# Altium schematic symbol library FPGA_Xilinx_Virtex5.SchLib: 41 symbols (part 20 of 27)
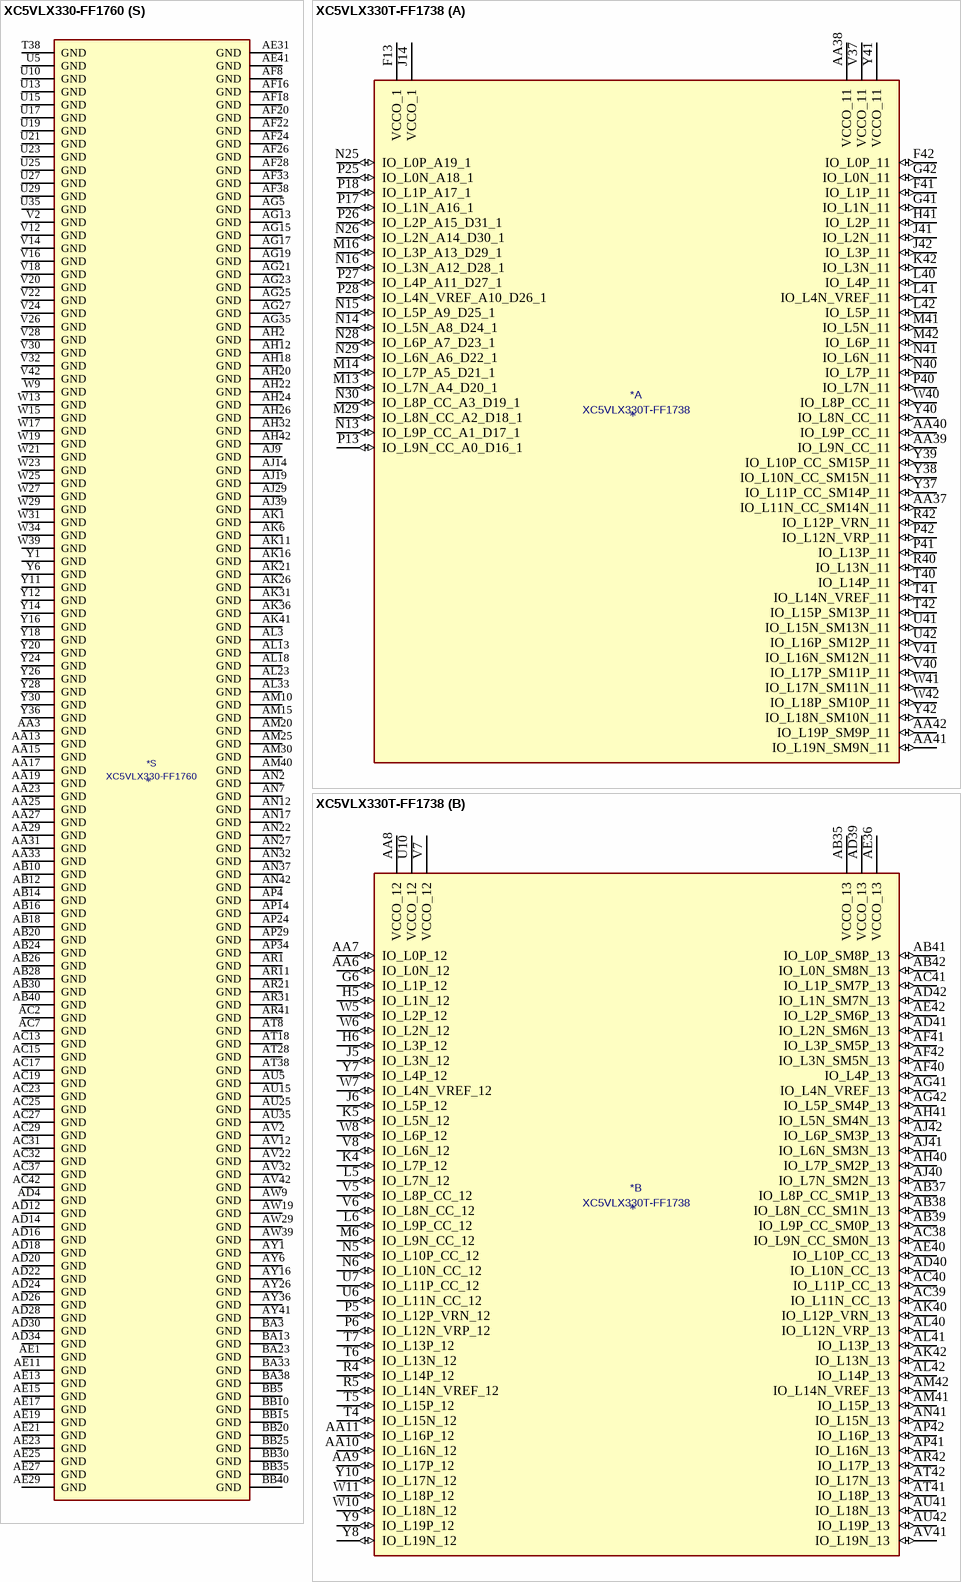
[diagram p156: symbols XC5VLX330-FF1760 to XC5VLX330T-FF1738]

## XC5VLX330-FF1760
designator *  value XC5VLX330-FF1760
ki_keywords: FPGA; ki_description: Virtex 5 LX 330 XC5VLX330-FF1760
part A pins: AA37 IO_L11N_CC_SM14N_11 (io), AA39 IO_L9N_CC_11 (io), AA40 IO_L9P_CC_11 (io), AA41 IO_L19N_SM9N_11 (io), AA42 IO_L19P_SM9P_11 (io), E16 VCCO_1 (power), F41 IO_L1P_11 (io), F42 IO_L0P_11 (io), G41 IO_L1N_11 (io), G42 IO_L0N_11 (io), H41 IO_L2P_11 (io), J14 VCCO_1 (power), J41 IO_L2N_11 (io), J42 IO_L3P_11 (io), K42 IO_L3N_11 (io), L40 IO_L4P_11 (io), L41 IO_L4N_VREF_11 (io), L42 IO_L5P_11 (io), M13 IO_L1P_A17_1 (io), M29 IO_L6N_A6_D22_1 (io), M41 IO_L5N_11 (io), M42 IO_L6P_11 (io), N13 IO_L1N_A16_1 (io), N14 IO_L7P_A5_D21_1 (io), N15 IO_L5P_A9_D25_1 (io), N28 IO_L4P_A11_D27_1 (io), N29 IO_L6P_A7_D23_1 (io), N30 IO_L8N_CC_A2_D18_1 (io), N40 IO_L7P_11 (io), N41 IO_L6N_11 (io), P13 IO_L7N_A4_D20_1 (io), P15 IO_L5N_A8_D24_1 (io), P16 IO_L9P_CC_A1_D17_1 (io), P17 IO_L3P_A13_D29_1 (io), P26 IO_L2N_A14_D30_1 (io), P27 IO_L2P_A15_D31_1 (io), P28 IO_L4N_VREF_A10_D26_1 (io), P30 IO_L8P_CC_A3_D19_1 (io), P40 IO_L7N_11 (io), P41 IO_L13P_11 (io), P42 IO_L12N_VRP_11 (io), R15 IO_L9N_CC_A0_D16_1 (io), R17 IO_L3N_A12_D28_1 (io), R27 IO_L0N_A18_1 (io), R28 IO_L0P_A19_1 (io), R40 IO_L13N_11 (io), R42 IO_L12P_VRN_11 (io), T40 IO_L14P_11 (io), T41 IO_L14N_VREF_11 (io), T42 IO_L15P_SM13P_11 (io), U40 VCCO_11 (power), U41 IO_L15N_SM13N_11 (io), U42 IO_L16P_SM12P_11 (io), V37 VCCO_11 (power), V40 IO_L17P_SM11P_11 (io), V41 IO_L16N_SM12N_11 (io), W40 IO_L8P_CC_11 (io), W41 IO_L17N_SM11N_11 (io), W42 IO_L18P_SM10P_11 (io), Y37 IO_L11P_CC_SM14P_11 (io), Y38 IO_L10N_CC_SM15N_11 (io), Y39 IO_L10P_CC_SM15P_11 (io), Y40 IO_L8N_CC_11 (io), Y41 VCCO_11 (power), Y42 IO_L18N_SM10N_11 (io)
part B pins: AA1 IO_L18P_12 (io), AA2 IO_L18N_12 (io), AA4 IO_L16P_12 (io), AA5 IO_L17N_12 (io), AA8 VCCO_12 (power), AA38 VCCO_13 (power), AB5 VCCO_12 (power), AB35 VCCO_13 (power), AB37 IO_L8P_CC_SM1P_13 (io), AB38 IO_L8N_CC_SM1N_13 (io), AB39 IO_L9P_CC_SM0P_13 (io), AB41 IO_L0P_SM8P_13 (io), AB42 IO_L0N_SM8N_13 (io), AC38 IO_L9N_CC_SM0N_13 (io), AC39 IO_L11N_CC_13 (io), AC40 IO_L11P_CC_13 (io), AC41 IO_L1P_SM7P_13 (io), AD39 VCCO_13 (power), AD40 IO_L10N_CC_13 (io), AD41 IO_L2N_SM6N_13 (io), AD42 IO_L1N_SM7N_13 (io), AE40 IO_L10P_CC_13 (io), AE42 IO_L2P_SM6P_13 (io), AF40 IO_L4P_13 (io), AF41 IO_L3P_SM5P_13 (io), AF42 IO_L3N_SM5N_13 (io), AG41 IO_L4N_VREF_13 (io), AG42 IO_L5P_SM4P_13 (io), AH40 IO_L7P_SM2P_13 (io), AH41 IO_L5N_SM4N_13 (io), AJ40 IO_L7N_SM2N_13 (io), AJ41 IO_L6N_SM3N_13 (io), AJ42 IO_L6P_SM3P_13 (io), AK40 IO_L12P_VRN_13 (io), AK42 IO_L13N_13 (io), AL40 IO_L12N_VRP_13 (io), AL41 IO_L13P_13 (io), AL42 IO_L14P_13 (io), AM41 IO_L15P_13 (io), AM42 IO_L14N_VREF_13 (io), AN41 IO_L15N_13 (io), AP41 IO_L16N_13 (io), AP42 IO_L16P_13 (io), AR42 IO_L17P_13 (io), AT41 IO_L18P_13 (io), AT42 IO_L17N_13 (io), AU41 IO_L18N_13 (io), AU42 IO_L19P_13 (io), AV41 IO_L19N_13 (io), E2 IO_L0P_12 (io), F1 IO_L1N_12 (io), F2 IO_L0N_12 (io), G1 IO_L3P_12 (io), G2 IO_L1P_12 (io), H1 IO_L3N_12 (io), J1 IO_L2N_12 (io), J2 IO_L2P_12 (io), K2 IO_L5P_12 (io), L1 IO_L5N_12 (io), L2 IO_L4P_12 (io), M1 IO_L6P_12 (io), M2 IO_L4N_VREF_12 (io), M3 IO_L7P_12 (io), N1 IO_L6N_12 (io), N3 IO_L7N_12 (io), P1 IO_L9N_CC_12 (io), P2 IO_L9P_CC_12 (io), P3 IO_L8P_CC_12 (io), R2 IO_L10P_CC_12 (io), R3 IO_L8N_CC_12 (io), T1 IO_L11N_CC_12 (io), T2 IO_L10N_CC_12 (io), U1 IO_L11P_CC_12 (io), U2 IO_L12N_VRP_12 (io), U3 IO_L12P_VRN_12 (io), V1 IO_L15N_12 (io), V3 IO_L13P_12 (io), V4 IO_L13N_12 (io), W1 IO_L15P_12 (io), W2 IO_L14P_12 (io), W3 IO_L14N_VREF_12 (io), W4 VCCO_12 (power), Y2 IO_L19P_12 (io), Y3 IO_L19N_12 (io), Y4 IO_L16N_12 (io), Y5 IO_L17P_12 (io)
part C pins: AA34 IO_L17P_15 (io), AA35 IO_L16P_15 (io), AA36 IO_L16N_15 (io), AB1 IO_L5N_14 (io), AB2 IO_L5P_14 (io), AB3 IO_L3P_14 (io), AB4 IO_L3N_14 (io), AB6 IO_L0P_14 (io), AC1 IO_L6P_14 (io), AC3 IO_L2P_14 (io), AC4 IO_L1P_14 (io), AC5 IO_L1N_14 (io), AC6 IO_L0N_14 (io), AD1 IO_L6N_14 (io), AD2 IO_L4P_14 (io), AD3 IO_L2N_14 (io), AD9 VCCO_14 (power), AE2 IO_L7P_14 (io), AE3 IO_L4N_VREF_14 (io), AE6 VCCO_14 (power), AF1 IO_L7N_14 (io), AF2 IO_L8P_CC_14 (io), AG1 IO_L11N_CC_14 (io), AG2 IO_L8N_CC_14 (io), AG3 IO_L9P_CC_14 (io), AG10 VCCO_14 (power), AH1 IO_L11P_CC_14 (io), AH3 IO_L9N_CC_14 (io), AJ1 IO_L13N_14 (io), AJ2 IO_L10P_CC_14 (io), AJ3 IO_L10N_CC_14 (io), AK2 IO_L13P_14 (io), AK3 IO_L12N_VRP_14 (io), AL1 IO_L15N_14 (io), AL2 IO_L12P_VRN_14 (io), AM1 IO_L15P_14 (io), AM2 IO_L14N_VREF_14 (io), AM3 IO_L14P_14 (io), AN1 IO_L17N_14 (io), AP1 IO_L17P_14 (io), AP2 IO_L16N_14 (io), AR2 IO_L16P_14 (io), AT1 IO_L18P_14 (io), AT2 IO_L18N_14 (io), AU1 IO_L19N_14 (io), AU2 IO_L19P_14 (io), E39 IO_L3P_15 (io), E40 IO_L3N_15 (io), F39 IO_L2P_15 (io), F40 IO_L2N_15 (io), G38 IO_L1P_15 (io), G39 IO_L1N_15 (io), H38 IO_L0P_15 (io), H39 IO_L0N_15 (io), H40 IO_L10P_CC_15 (io), J38 IO_L9N_CC_15 (io), J40 IO_L10N_CC_15 (io), K38 IO_L9P_CC_15 (io), K39 IO_L11N_CC_15 (io), K40 IO_L11P_CC_15 (io), L39 IO_L8N_CC_15 (io), M35 VCCO_15 (power), M38 IO_L8P_CC_15 (io), M39 IO_L7N_15 (io), N38 IO_L6N_15 (io), N39 IO_L7P_15 (io), P37 IO_L5N_15 (io), P38 IO_L6P_15 (io), P39 VCCO_15 (power), R36 VCCO_15 (power), R37 IO_L5P_15 (io), R38 IO_L4N_VREF_15 (io), R39 IO_L4P_15 (io), T37 IO_L13P_15 (io), T39 IO_L14P_15 (io), U37 IO_L12N_VRP_15 (io), U38 IO_L13N_15 (io), U39 IO_L14N_VREF_15 (io), V38 IO_L12P_VRN_15 (io), V39 IO_L15P_15 (io), W35 IO_L18N_15 (io), W36 IO_L19P_15 (io), W37 IO_L19N_15 (io), W38 IO_L15N_15 (io), Y34 IO_L17N_15 (io), Y35 IO_L18P_15 (io)
part D pins: AA6 IO_L15N_16 (io), AA7 IO_L15P_16 (io), AA9 IO_L16N_16 (io), AA10 IO_L19N_16 (io), AA11 IO_L19P_16 (io), AB34 IO_L0P_17 (io), AB36 IO_L1N_17 (io), AC34 IO_L0N_17 (io), AC35 IO_L1P_17 (io), AC36 IO_L2P_17 (io), AD35 IO_L2N_17 (io), AD36 IO_L3P_17 (io), AD37 IO_L3N_17 (io), AD38 IO_L4N_VREF_17 (io), AE36 VCCO_17 (power), AE37 IO_L4P_17 (io), AE38 IO_L5N_17 (io), AE39 IO_L5P_17 (io), AF37 IO_L7N_17 (io), AF39 IO_L6P_17 (io), AG37 IO_L7P_17 (io), AG38 IO_L6N_17 (io), AG39 IO_L12P_VRN_17 (io), AG40 VCCO_17 (power), AH37 VCCO_17 (power), AH38 IO_L15N_17 (io), AH39 IO_L12N_VRP_17 (io), AJ37 IO_L15P_17 (io), AJ38 IO_L13P_17 (io), AK37 IO_L14N_VREF_17 (io), AK38 IO_L14P_17 (io), AK39 IO_L13N_17 (io), AL37 IO_L19N_17 (io), AL39 IO_L16P_17 (io), AM37 IO_L19P_17 (io), AM38 IO_L18N_17 (io), AM39 IO_L16N_17 (io), AN38 IO_L18P_17 (io), AN39 IO_L17P_17 (io), AN40 IO_L8P_CC_17 (io), AP38 IO_L17N_17 (io), AP40 IO_L8N_CC_17 (io), AR39 IO_L11N_CC_17 (io), AR40 IO_L9P_CC_17 (io), AT39 IO_L11P_CC_17 (io), AT40 IO_L9N_CC_17 (io), AU39 IO_L10N_CC_17 (io), AV40 IO_L10P_CC_17 (io), E3 IO_L1P_16 (io), E4 IO_L1N_16 (io), F4 IO_L0N_16 (io), G3 IO_L3N_16 (io), G4 IO_L0P_16 (io), H3 IO_L3P_16 (io), H4 IO_L2P_16 (io), J3 IO_L2N_16 (io), K3 IO_L5P_16 (io), K4 IO_L5N_16 (io), L4 IO_L4N_VREF_16 (io), L5 IO_L4P_16 (io), M4 IO_L7N_16 (io), N4 IO_L7P_16 (io), N5 IO_L6P_16 (io), P5 IO_L6N_16 (io), R4 IO_L9N_CC_16 (io), R5 IO_L9P_CC_16 (io), R6 VCCO_16 (power), T3 VCCO_16 (power), T4 IO_L10N_CC_16 (io), T5 IO_L8N_CC_16 (io), T6 IO_L8P_CC_16 (io), U4 IO_L10P_CC_16 (io), U6 IO_L11P_CC_16 (io), V5 IO_L11N_CC_16 (io), V6 IO_L13N_16 (io), V7 VCCO_16 (power), W5 IO_L13P_16 (io), W6 IO_L14N_VREF_16 (io), W7 IO_L12P_VRN_16 (io), W8 IO_L12N_VRP_16 (io), W10 IO_L18N_16 (io), W11 IO_L18P_16 (io), Y7 IO_L14P_16 (io), Y8 IO_L16P_16 (io), Y9 IO_L17N_16 (io), Y10 IO_L17P_16 (io)
part E pins: AA32 IO_L19N_19 (io), AB7 IO_L4N_VREF_18 (io), AB8 IO_L3P_18 (io), AB9 IO_L3N_18 (io), AB11 IO_L0P_18 (io), AC8 IO_L4P_18 (io), AC9 IO_L2N_18 (io), AC10 IO_L2P_18 (io), AC11 IO_L0N_18 (io), AD5 IO_L5P_18 (io), AD6 IO_L6P_18 (io), AD7 IO_L7P_18 (io), AD8 IO_L7N_18 (io), AD10 IO_L1N_18 (io), AD11 IO_L1P_18 (io), AE4 IO_L8P_CC_18 (io), AE5 IO_L5N_18 (io), AE7 IO_L6N_18 (io), AF3 VCCO_18 (power), AF4 IO_L8N_CC_18 (io), AF5 IO_L9N_CC_18 (io), AF6 IO_L9P_CC_18 (io), AG4 IO_L11N_CC_18 (io), AG6 IO_L10P_CC_18 (io), AH4 IO_L11P_CC_18 (io), AH5 IO_L13N_18 (io), AH6 IO_L10N_CC_18 (io), AH7 VCCO_18 (power), AJ4 VCCO_18 (power), AJ5 IO_L12P_VRN_18 (io), AJ6 IO_L13P_18 (io), AK4 IO_L12N_VRP_18 (io), AK5 IO_L15P_18 (io), AL4 IO_L15N_18 (io), AL5 IO_L14N_VREF_18 (io), AL6 IO_L14P_18 (io), AM4 IO_L17N_18 (io), AM6 IO_L19P_18 (io), AN3 IO_L16N_18 (io), AN4 IO_L17P_18 (io), AN5 IO_L19N_18 (io), AP3 IO_L16P_18 (io), AR3 IO_L18P_18 (io), AR4 IO_L18N_18 (io), D37 IO_L15N_19 (io), E37 IO_L14N_VREF_19 (io), E38 IO_L15P_19 (io), F36 IO_L13P_19 (io), F37 IO_L14P_19 (io), G36 IO_L13N_19 (io), G37 IO_L12N_VRP_19 (io), H35 IO_L6P_19 (io), H36 IO_L12P_VRN_19 (io), H37 VCCO_19 (power), J35 IO_L5N_19 (io), J36 IO_L6N_19 (io), J37 IO_L7N_19 (io), K35 IO_L5P_19 (io), K37 IO_L7P_19 (io), K41 VCCO_19 (power), L35 IO_L4N_VREF_19 (io), L36 IO_L4P_19 (io), L37 IO_L2P_19 (io), L38 VCCO_19 (power), M36 IO_L1N_19 (io), M37 IO_L2N_19 (io), N35 IO_L1P_19 (io), N36 IO_L3P_19 (io), P35 IO_L0N_19 (io), P36 IO_L3N_19 (io), R34 IO_L0P_19 (io), R35 IO_L10P_CC_19 (io), T34 IO_L9P_CC_19 (io), T35 IO_L8N_CC_19 (io), T36 IO_L10N_CC_19 (io), U33 IO_L9N_CC_19 (io), U34 IO_L8P_CC_19 (io), U36 IO_L11P_CC_19 (io), V33 IO_L17P_19 (io), V34 IO_L16N_19 (io), V35 IO_L16P_19 (io), V36 IO_L11N_CC_19 (io), W32 IO_L18N_19 (io), W33 IO_L17N_19 (io), Y32 IO_L19P_19 (io), Y33 IO_L18P_19 (io)
part F pins: AH16 IO_L0P_CC_RS1_2 (io), AH29 IO_L1N_CC_A24_2 (io), AH30 IO_L1P_CC_A25_2 (io), AJ13 IO_L6P_D7_2 (io), AJ15 IO_L0N_CC_RS0_2 (io), AJ16 IO_L2P_A23_2 (io), AJ17 IO_L2N_A22_2 (io), AJ26 IO_L9P_D1_FS1_2 (io), AJ27 IO_L9N_D0_FS0_2 (io), AJ28 IO_L7P_D5_2 (io), AJ30 IO_L3N_A20_2 (io), AK13 IO_L6N_D6_2 (io), AK14 IO_L4P_FCS_B_2 (io), AK15 IO_L4N_VREF_FOE_B_MOSI_2 (io), AK29 IO_L7N_D4_2 (io), AK30 IO_L3P_A21_2 (io), AL14 IO_L8N_D2_FS2_2 (io), AL15 IO_L8P_D3_2 (io), AL29 IO_L5P_FWE_B_2 (io), AL30 IO_L5N_CSO_B_2 (io), AR26 VCCO_2 (power), AV27 VCCO_2 (power), E5 IO_L1N_20 (io), F5 IO_L1P_20 (io), F6 IO_L0N_20 (io), G6 IO_L0P_20 (io), G7 IO_L2P_20 (io), H5 IO_L3N_20 (io), H6 IO_L2N_20 (io), J5 IO_L3P_20 (io), J6 IO_L5N_20 (io), J7 IO_L4P_20 (io), K5 IO_L5P_20 (io), K7 IO_L4N_VREF_20 (io), L6 IO_L7N_20 (io), L7 IO_L7P_20 (io), L8 VCCO_20 (power), M5 VCCO_20 (power), M6 IO_L6N_20 (io), M7 IO_L6P_20 (io), M8 IO_L9P_CC_20 (io), M9 IO_L9N_CC_20 (io), N6 IO_L11P_CC_20 (io), N8 IO_L10N_CC_20 (io), N9 IO_L8N_CC_20 (io), P6 IO_L11N_CC_20 (io), P7 IO_L10P_CC_20 (io), P8 IO_L8P_CC_20 (io), P9 VCCO_20 (power), R7 IO_L14P_20 (io), R8 IO_L14N_VREF_20 (io), R9 IO_L13P_20 (io), R10 IO_L12N_VRP_20 (io), T7 IO_L15N_20 (io), T9 IO_L13N_20 (io), T10 IO_L12P_VRN_20 (io), T11 IO_L17N_20 (io), U7 IO_L15P_20 (io), U8 IO_L16P_20 (io), U9 IO_L16N_20 (io), U11 IO_L17P_20 (io), V8 IO_L18N_20 (io), V9 IO_L18P_20 (io), V10 IO_L19N_20 (io), V11 IO_L19P_20 (io)
part G pins: AB32 IO_L0N_21 (io), AB33 IO_L0P_21 (io), AC33 IO_L1P_21 (io), AD32 IO_L1N_21 (io), AD33 IO_L2P_21 (io), AE8 IO_L1N_22 (io), AE9 IO_L1P_22 (io), AE10 IO_L0N_22 (io), AE32 IO_L2N_21 (io), AE33 IO_L3P_21 (io), AE34 IO_L3N_21 (io), AE35 IO_L8P_CC_21 (io), AF7 IO_L3N_22 (io), AF9 IO_L2N_22 (io), AF10 IO_L2P_22 (io), AF11 IO_L0P_22 (io), AF12 IO_L8N_CC_22 (io), AF34 IO_L8N_CC_21 (io), AF35 IO_L9P_CC_21 (io), AF36 IO_L9N_CC_21 (io), AG7 IO_L3P_22 (io), AG8 IO_L4N_VREF_22 (io), AG9 IO_L7N_22 (io), AG11 IO_L9N_CC_22 (io), AG12 IO_L8P_CC_22 (io), AG34 IO_L10N_CC_21 (io), AG36 IO_L11N_CC_21 (io), AH8 IO_L4P_22 (io), AH9 IO_L6P_22 (io), AH10 IO_L7P_22 (io), AH11 IO_L9P_CC_22 (io), AH34 IO_L10P_CC_21 (io), AH35 IO_L11P_CC_21 (io), AH36 IO_L16P_21 (io), AJ7 IO_L5P_22 (io), AJ8 IO_L6N_22 (io), AJ34 VCCO_21 (power), AJ35 IO_L17P_21 (io), AJ36 IO_L16N_21 (io), AK7 IO_L5N_22 (io), AK8 IO_L10P_CC_22 (io), AK9 IO_L11N_CC_22 (io), AK34 IO_L19N_21 (io), AK35 IO_L17N_21 (io), AL7 IO_L10N_CC_22 (io), AL8 VCCO_22 (power), AL9 IO_L11P_CC_22 (io), AL34 IO_L19P_21 (io), AL35 IO_L18N_21 (io), AL36 IO_L18P_21 (io), AL38 VCCO_21 (power), AM5 VCCO_22 (power), AM7 IO_L12P_VRN_22 (io), AM8 IO_L13N_22 (io), AM34 IO_L15N_21 (io), AM35 VCCO_21 (power), AM36 IO_L14P_21 (io), AN6 IO_L12N_VRP_22 (io), AN8 IO_L13P_22 (io), AN34 IO_L15P_21 (io), AN35 IO_L14N_VREF_21 (io), AN36 IO_L13N_21 (io), AP5 IO_L14N_VREF_22 (io), AP6 IO_L15N_22 (io), AP7 IO_L15P_22 (io), AP9 VCCO_22 (power), AP35 IO_L13P_21 (io), AP36 IO_L12N_VRP_21 (io), AP37 IO_L12P_VRN_21 (io), AR5 IO_L14P_22 (io), AR37 IO_L7P_21 (io), AR38 IO_L6N_21 (io), AT4 IO_L17N_22 (io), AT5 IO_L18P_22 (io), AT6 IO_L18N_22 (io), AT36 IO_L7N_21 (io), AT37 IO_L6P_21 (io), AU3 IO_L19N_22 (io), AU4 IO_L17P_22 (io), AU37 IO_L5N_21 (io), AU38 IO_L5P_21 (io), AV3 IO_L19P_22 (io), AV4 IO_L16N_22 (io), AV5 IO_L16P_22 (io), AV38 IO_L4N_VREF_21 (io), AV39 IO_L4P_21 (io)
part H pins: D39 VCCO_23 (power), E7 IO_L18P_24 (io), E8 IO_L18N_24 (io), E9 IO_L14N_VREF_24 (io), E10 IO_L14P_24 (io), E12 IO_L10P_CC_24 (io), E13 IO_L10N_CC_24 (io), E32 IO_L11P_CC_23 (io), E33 IO_L11N_CC_23 (io), E34 IO_L9P_CC_23 (io), E35 IO_L8N_CC_23 (io), E36 VCCO_23 (power), F3 VCCO_24 (power), F7 IO_L19P_24 (io), F9 IO_L15P_24 (io), F10 IO_L12P_VRN_24 (io), F11 IO_L12N_VRP_24 (io), F12 IO_L11P_CC_24 (io), F31 IO_L10P_CC_23 (io), F32 IO_L10N_CC_23 (io), F34 IO_L9N_CC_23 (io), F35 IO_L8P_CC_23 (io), G8 IO_L19N_24 (io), G9 IO_L15N_24 (io), G11 IO_L11N_CC_24 (io), G12 IO_L9N_CC_24 (io), G13 IO_L8N_CC_24 (io), G31 IO_L6N_23 (io), G32 IO_L6P_23 (io), G33 IO_L5P_23 (io), G34 IO_L4N_VREF_23 (io), G40 VCCO_23 (power), H7 VCCO_24 (power), H8 IO_L16P_24 (io), H9 IO_L13P_24 (io), H10 IO_L13N_24 (io), H11 IO_L9P_CC_24 (io), H13 IO_L8P_CC_24 (io), H31 IO_L7P_23 (io), H33 IO_L5N_23 (io), H34 IO_L4P_23 (io), J4 VCCO_24 (power), J8 IO_L16N_24 (io), J10 IO_L7P_24 (io), J11 IO_L7N_24 (io), J12 IO_L6N_24 (io), J31 IO_L7N_23 (io), J32 IO_L14N_VREF_23 (io), J33 IO_L13N_23 (io), K8 IO_L17P_24 (io), K9 IO_L17N_24 (io), K10 IO_L4N_VREF_24 (io), K12 IO_L6P_24 (io), K32 IO_L14P_23 (io), K33 IO_L13P_23 (io), K34 IO_L12N_VRP_23 (io), L9 IO_L4P_24 (io), L10 IO_L5N_24 (io), L11 IO_L5P_24 (io), L12 IO_L2N_24 (io), L31 IO_L15N_23 (io), L32 IO_L15P_23 (io), L34 IO_L12P_VRN_23 (io), M11 IO_L3N_24 (io), M12 IO_L2P_24 (io), M31 IO_L2N_23 (io), M32 IO_L2P_23 (io), M33 IO_L1N_23 (io), M34 IO_L1P_23 (io), N10 IO_L1N_24 (io), N11 IO_L3P_24 (io), N31 IO_L3P_23 (io), N33 IO_L0P_23 (io), N34 IO_L0N_23 (io), P10 IO_L1P_24 (io), P11 IO_L0N_24 (io), P12 IO_L0P_24 (io), P31 IO_L3N_23 (io), P32 IO_L16N_23 (io), P33 IO_L16P_23 (io), R32 IO_L17N_23 (io), R33 IO_L17P_23 (io), T31 IO_L19N_23 (io), T32 IO_L18P_23 (io), U31 IO_L19P_23 (io), U32 IO_L18N_23 (io)
part I pins: AF31 IO_L0N_25 (io), AF32 IO_L1P_25 (io), AG31 IO_L0P_25 (io), AG32 IO_L2N_25 (io), AG33 IO_L1N_25 (io), AH31 IO_L3P_25 (io), AH33 IO_L2P_25 (io), AJ10 IO_L18P_26 (io), AJ11 IO_L18N_26 (io), AJ12 IO_L19P_26 (io), AJ31 IO_L3N_25 (io), AJ32 IO_L17P_25 (io), AJ33 IO_L16N_25 (io), AK10 IO_L17P_26 (io), AK12 IO_L19N_26 (io), AK32 IO_L17N_25 (io), AK33 IO_L16P_25 (io), AL10 IO_L17N_26 (io), AL11 IO_L16P_26 (io), AL12 IO_L16N_26 (io), AL31 IO_L19P_25 (io), AL32 IO_L18P_25 (io), AM9 IO_L13P_26 (io), AM11 IO_L15N_26 (io), AM12 IO_L15P_26 (io), AM31 IO_L19N_25 (io), AM32 IO_L18N_25 (io), AM33 IO_L15N_25 (io), AN9 IO_L12P_VRN_26 (io), AN10 IO_L13N_26 (io), AN11 IO_L14P_26 (io), AN31 IO_L12N_VRP_25 (io), AN33 IO_L15P_25 (io), AP8 IO_L12N_VRP_26 (io), AP10 IO_L14N_VREF_26 (io), AP11 IO_L11P_CC_26 (io), AP12 IO_L11N_CC_26 (io), AP31 IO_L12P_VRN_25 (io), AP32 IO_L13N_25 (io), AP33 IO_L14N_VREF_25 (io), AP39 VCCO_25 (power), AR6 VCCO_26 (power), AR7 IO_L3P_26 (io), AR8 IO_L3N_26 (io), AR9 IO_L9P_CC_26 (io), AR10 IO_L9N_CC_26 (io), AR12 IO_L10P_CC_26 (io), AR32 IO_L13P_25 (io), AR33 IO_L14P_25 (io), AR34 IO_L7N_25 (io), AR35 IO_L7P_25 (io), AR36 VCCO_25 (power), AT3 VCCO_26 (power), AT7 IO_L2P_26 (io), AT9 IO_L4N_VREF_26 (io), AT10 IO_L8P_CC_26 (io), AT11 IO_L8N_CC_26 (io), AT12 IO_L10N_CC_26 (io), AT31 IO_L11N_CC_25 (io), AT32 IO_L11P_CC_25 (io), AT34 IO_L6N_25 (io), AT35 IO_L5N_25 (io), AU6 IO_L2N_26 (io), AU7 IO_L0N_26 (io), AU8 IO_L1P_26 (io), AU9 IO_L4P_26 (io), AU11 IO_L7N_26 (io), AU12 IO_L6N_26 (io), AU13 IO_L6P_26 (io), AU31 IO_L10N_CC_25 (io), AU32 IO_L8P_CC_25 (io), AU33 IO_L8N_CC_25 (io), AU34 IO_L6P_25 (io), AU36 IO_L5P_25 (io), AU40 VCCO_25 (power), AV6 IO_L0P_26 (io), AV8 IO_L1N_26 (io), AV9 IO_L5N_26 (io), AV10 IO_L5P_26 (io), AV11 IO_L7P_26 (io), AV31 IO_L10P_CC_25 (io), AV33 IO_L9P_CC_25 (io), AV34 IO_L9N_CC_25 (io), AV35 IO_L4P_25 (io), AV36 IO_L4N_VREF_25 (io), AW4 VCCO_26 (power)
part J pins: A2 IO_L18P_28 (io), A4 IO_L13N_28 (io), A5 IO_L12P_VRN_28 (io), A6 IO_L12N_VRP_28 (io), A7 IO_L11P_CC_28 (io), A9 IO_L7P_28 (io), A10 IO_L5N_28 (io), A11 IO_L5P_28 (io), A12 IO_L2N_28 (io), A30 IO_L2P_27 (io), A31 IO_L2N_27 (io), A32 IO_L3P_27 (io), A34 IO_L7P_27 (io), A35 IO_L7N_27 (io), A36 IO_L10N_CC_27 (io), A37 IO_L10P_CC_27 (io), A39 IO_L15P_27 (io), A40 IO_L15N_27 (io), A41 IO_L16P_27 (io), B1 IO_L17N_28 (io), B2 IO_L18N_28 (io), B3 IO_L16P_28 (io), B4 IO_L13P_28 (io), B6 IO_L9P_CC_28 (io), B7 IO_L11N_CC_28 (io), B8 IO_L8N_CC_28 (io), B9 IO_L7N_28 (io), B11 IO_L1P_28 (io), B12 IO_L2P_28 (io), B31 IO_L1P_27 (io), B32 IO_L3N_27 (io), B33 IO_L4P_27 (io), B34 IO_L6N_27 (io), B35 VCCO_27 (power), B36 IO_L11N_CC_27 (io), B37 IO_L11P_CC_27 (io), B38 IO_L14N_VREF_27 (io), B39 IO_L14P_27 (io), B41 IO_L16N_27 (io), B42 IO_L17P_27 (io), C1 IO_L17P_28 (io), C3 IO_L16N_28 (io), C4 IO_L15N_28 (io), C5 IO_L14P_28 (io), C6 IO_L9N_CC_28 (io), C8 IO_L8P_CC_28 (io), C9 IO_L4P_28 (io), C10 IO_L6P_28 (io), C11 IO_L1N_28 (io), C13 IO_L0P_28 (io), C30 IO_L1N_27 (io), C31 IO_L0N_27 (io), C32 VCCO_27 (power), C33 IO_L4N_VREF_27 (io), C34 IO_L6P_27 (io), C35 IO_L9N_CC_27 (io), C36 IO_L9P_CC_27 (io), C38 IO_L12P_VRN_27 (io), C39 IO_L13P_27 (io), C40 IO_L13N_27 (io), C41 IO_L17N_27 (io), D1 IO_L19P_28 (io), D2 IO_L19N_28 (io), D3 IO_L15P_28 (io), D5 IO_L14N_VREF_28 (io), D6 IO_L10N_CC_28 (io), D7 IO_L10P_CC_28 (io), D8 IO_L4N_VREF_28 (io), D9 VCCO_28 (power), D10 IO_L6N_28 (io), D11 IO_L3P_28 (io), D12 IO_L3N_28 (io), D13 IO_L0N_28 (io), D31 IO_L0P_27 (io), D32 IO_L5P_27 (io), D33 IO_L5N_27 (io), D35 IO_L8P_CC_27 (io), D36 IO_L8N_CC_27 (io), D38 IO_L12N_VRP_27 (io), D40 IO_L18P_27 (io), D41 IO_L18N_27 (io), D42 IO_L19N_27 (io), E6 VCCO_28 (power), E42 IO_L19P_27 (io), F33 VCCO_27 (power), G10 VCCO_28 (power)
part K pins: AT33 VCCO_29 (power), AV37 VCCO_29 (power), AW31 IO_L19N_29 (io), AW32 IO_L15N_29 (io), AW33 IO_L15P_29 (io), AW34 VCCO_29 (power), AW35 IO_L11N_CC_29 (io), AW36 IO_L9N_CC_29 (io), AW37 IO_L6N_29 (io), AW38 IO_L7P_29 (io), AW40 IO_L1N_29 (io), AW41 IO_L1P_29 (io), AW42 IO_L0N_29 (io), AY30 IO_L19P_29 (io), AY32 IO_L16P_29 (io), AY33 IO_L14P_29 (io), AY34 IO_L14N_VREF_29 (io), AY35 IO_L11P_CC_29 (io), AY37 IO_L9P_CC_29 (io), AY38 IO_L6P_29 (io), AY39 IO_L7N_29 (io), AY40 IO_L2P_29 (io), AY42 IO_L0P_29 (io), BA30 IO_L18P_29 (io), BA31 IO_L18N_29 (io), BA32 IO_L16N_29 (io), BA34 IO_L13N_29 (io), BA35 IO_L12N_VRP_29 (io), BA36 IO_L10N_CC_29 (io), BA37 IO_L8N_CC_29 (io), BA39 IO_L5N_29 (io), BA40 IO_L4P_29 (io), BA41 IO_L2N_29 (io), BA42 IO_L3P_29 (io), BB31 IO_L17N_29 (io), BB32 IO_L17P_29 (io), BB33 IO_L13P_29 (io), BB34 IO_L12P_VRN_29 (io), BB36 IO_L10P_CC_29 (io), BB37 IO_L8P_CC_29 (io), BB38 IO_L5P_29 (io), BB39 IO_L4N_VREF_29 (io), BB41 IO_L3N_29 (io), E26 VCCO_3 (power), J13 IO_L2N_GC_VRP_3 (io), J24 VCCO_3 (power), J30 IO_L7P_GC_3 (io), K13 IO_L2P_GC_VRN_3 (io), K14 IO_L0N_CC_GC_3 (io), K15 IO_L0P_CC_GC_3 (io), K28 IO_L5P_GC_3 (io), K29 IO_L5N_GC_3 (io), K30 IO_L7N_GC_3 (io), L14 IO_L6N_GC_3 (io), L15 IO_L4P_GC_3 (io), L16 IO_L4N_GC_VREF_3 (io), L27 IO_L3P_GC_3 (io), L29 IO_L9P_GC_3 (io), L30 IO_L9N_GC_3 (io), M14 IO_L6P_GC_3 (io), M16 IO_L8N_GC_3 (io), M27 IO_L1P_CC_GC_3 (io), M28 IO_L3N_GC_3 (io), N16 IO_L8P_GC_3 (io), N26 IO_L1N_CC_GC_3 (io)
part L pins: AU10 VCCO_30 (power), AV1 IO_L0P_30 (io), AV7 VCCO_30 (power), AW1 IO_L0N_30 (io), AW2 IO_L1P_30 (io), AW3 IO_L3N_30 (io), AW5 IO_L5N_30 (io), AW6 IO_L9N_CC_30 (io), AW7 IO_L9P_CC_30 (io), AW8 IO_L11N_CC_30 (io), AW10 IO_L13N_30 (io), AW11 IO_L16P_30 (io), AW12 IO_L16N_30 (io), AY2 IO_L1N_30 (io), AY3 IO_L3P_30 (io), AY4 IO_L6P_30 (io), AY5 IO_L5P_30 (io), AY7 IO_L11P_CC_30 (io), AY8 IO_L15P_30 (io), AY9 IO_L15N_30 (io), AY10 IO_L13P_30 (io), AY12 IO_L19N_30 (io), AY13 IO_L19P_30 (io), BA1 IO_L2P_30 (io), BA2 IO_L2N_30 (io), BA4 IO_L6N_30 (io), BA5 IO_L7P_30 (io), BA6 IO_L10N_CC_30 (io), BA7 IO_L8N_CC_30 (io), BA8 VCCO_30 (power), BA9 IO_L12N_VRP_30 (io), BA10 IO_L14N_VREF_30 (io), BA11 IO_L18N_30 (io), BA12 IO_L17P_30 (io), BB2 IO_L4P_30 (io), BB3 IO_L4N_VREF_30 (io), BB4 IO_L7N_30 (io), BB6 IO_L10P_CC_30 (io), BB7 IO_L8P_CC_30 (io), BB8 IO_L12P_VRN_30 (io), BB9 IO_L14P_30 (io), BB11 IO_L18P_30 (io), BB12 IO_L17N_30 (io), D15 IO_L0N_31 (io), D16 IO_L2P_31 (io), D17 IO_L2N_31 (io), D18 IO_L6P_31 (io), D20 IO_L9N_CC_31 (io), D21 IO_L9P_CC_31 (io), D22 IO_L8P_CC_31 (io), D23 IO_L8N_CC_31 (io), D25 IO_L12P_VRN_31 (io), D26 IO_L12N_VRP_31 (io), D27 IO_L17P_31 (io), D28 IO_L17N_31 (io), D29 VCCO_31 (power), D30 IO_L19P_31 (io), E14 IO_L0P_31 (io), E15 IO_L1P_31 (io), E17 IO_L4N_VREF_31 (io), E18 IO_L6N_31 (io), E19 IO_L7P_31 (io), E20 IO_L5P_31 (io), E22 IO_L10N_CC_31 (io), E23 IO_L11P_CC_31 (io), E24 IO_L13P_31 (io), E25 IO_L13N_31 (io), E27 IO_L14N_VREF_31 (io), E28 IO_L16N_31 (io), E29 IO_L16P_31 (io), E30 IO_L19N_31 (io), F14 IO_L1N_31 (io), F15 IO_L3N_31 (io), F16 IO_L3P_31 (io), F17 IO_L4P_31 (io), F19 IO_L7N_31 (io), F20 IO_L5N_31 (io), F21 IO_L10P_CC_31 (io), F24 IO_L11N_CC_31 (io), F25 IO_L15N_31 (io), F26 IO_L15P_31 (io), F27 IO_L14P_31 (io), F29 IO_L18N_31 (io), F30 IO_L18P_31 (io), G30 VCCO_31 (power), H27 VCCO_31 (power)
part M pins: A14 IO_L16P_32 (io), A15 IO_L16N_32 (io), A16 IO_L14P_32 (io), A17 IO_L14N_VREF_32 (io), A19 IO_L12P_VRN_32 (io), A20 IO_L10P_CC_32 (io), A21 IO_L11P_CC_32 (io), A22 IO_L11N_CC_32 (io), A24 IO_L6N_32 (io), A25 IO_L4N_VREF_32 (io), A26 IO_L1N_32 (io), A27 IO_L3N_32 (io), A29 IO_L0P_32 (io), AU14 IO_L18P_33 (io), AU16 IO_L14N_VREF_33 (io), AU17 IO_L14P_33 (io), AU18 IO_L12P_VRN_33 (io), AU19 IO_L12N_VRP_33 (io), AU22 IO_L9N_CC_33 (io), AU23 IO_L9P_CC_33 (io), AU24 IO_L3N_33 (io), AU26 IO_L1N_33 (io), AU27 IO_L4N_VREF_33 (io), AU28 IO_L4P_33 (io), AU30 VCCO_33 (power), AV13 IO_L16P_33 (io), AV14 IO_L18N_33 (io), AV15 IO_L19N_33 (io), AV16 IO_L17N_33 (io), AV18 IO_L15N_33 (io), AV19 IO_L13N_33 (io), AV20 IO_L10N_CC_33 (io), AV21 IO_L10P_CC_33 (io), AV23 IO_L7N_33 (io), AV24 IO_L7P_33 (io), AV25 IO_L3P_33 (io), AV26 IO_L1P_33 (io), AV28 IO_L6N_33 (io), AV29 IO_L0P_33 (io), AV30 IO_L2P_33 (io), AW13 IO_L16N_33 (io), AW15 IO_L19P_33 (io), AW16 IO_L17P_33 (io), AW17 IO_L15P_33 (io), AW18 IO_L13P_33 (io), AW20 IO_L11N_CC_33 (io), AW21 IO_L11P_CC_33 (io), AW22 IO_L5N_33 (io), AW23 IO_L5P_33 (io), AW25 IO_L8N_CC_33 (io), AW26 IO_L8P_CC_33 (io), AW27 IO_L6P_33 (io), AW28 IO_L0N_33 (io), AW30 IO_L2N_33 (io), AY31 VCCO_33 (power), B13 IO_L19P_32 (io), B14 IO_L19N_32 (io), B15 VCCO_32 (power), B16 IO_L17P_32 (io), B17 IO_L15P_32 (io), B18 IO_L15N_32 (io), B19 IO_L12N_VRP_32 (io), B21 IO_L10N_CC_32 (io), B22 IO_L8N_CC_32 (io), B23 IO_L6P_32 (io), B24 IO_L4P_32 (io), B26 IO_L7N_32 (io), B27 IO_L1P_32 (io), B28 IO_L3P_32 (io), B29 IO_L0N_32 (io), BA28 VCCO_33 (power), C12 VCCO_32 (power), C14 IO_L18P_32 (io), C15 IO_L18N_32 (io), C16 IO_L17N_32 (io), C18 IO_L13P_32 (io), C19 IO_L13N_32 (io), C20 IO_L9N_CC_32 (io), C21 IO_L9P_CC_32 (io), C23 IO_L8P_CC_32 (io), C24 IO_L5P_32 (io), C25 IO_L5N_32 (io), C26 IO_L7P_32 (io), C28 IO_L2N_32 (io), C29 IO_L2P_32 (io), F13 VCCO_32 (power)
part N pins: AK17 IO_L1N_GC_D12_4 (io), AK27 IO_L0N_GC_D14_4 (io), AK28 IO_L0P_GC_D15_4 (io), AL16 IO_L1P_GC_D13_4 (io), AL27 IO_L8P_CC_GC_4 (io), AM13 IO_L5P_GC_4 (io), AM14 IO_L5N_GC_4 (io), AM16 IO_L3N_GC_D8_4 (io), AM27 IO_L8N_CC_GC_4 (io), AM28 IO_L6P_GC_4 (io), AM29 IO_L2P_GC_D11_4 (io), AN13 IO_L9N_CC_GC_4 (io), AN14 IO_L7N_GC_VRP_4 (io), AN15 IO_L7P_GC_VRN_4 (io), AN16 IO_L3P_GC_D9_4 (io), AN28 IO_L6N_GC_4 (io), AN29 IO_L4N_GC_VREF_4 (io), AN30 IO_L2N_GC_D10_4 (io), AP13 IO_L9P_CC_GC_4 (io), AP30 IO_L4P_GC_4 (io), AT13 VCCO_34 (power), AV17 VCCO_4 (power), AW14 VCCO_34 (power), AY11 VCCO_34 (power), AY14 IO_L1P_34 (io), AY15 IO_L1N_34 (io), AY17 IO_L7P_34 (io), AY18 IO_L7N_34 (io), AY19 IO_L6P_34 (io), AY20 IO_L10N_CC_34 (io), AY22 IO_L11P_CC_34 (io), AY23 IO_L11N_CC_34 (io), AY24 IO_L12N_VRP_34 (io), AY25 IO_L12P_VRN_34 (io), AY27 IO_L17P_34 (io), AY28 IO_L17N_34 (io), AY29 IO_L19N_34 (io), BA14 IO_L0N_34 (io), BA15 IO_L3P_34 (io), BA16 IO_L2N_34 (io), BA17 IO_L5N_34 (io), BA18 VCCO_4 (power), BA19 IO_L6N_34 (io), BA20 IO_L10P_CC_34 (io), BA21 IO_L8P_CC_34 (io), BA22 IO_L8N_CC_34 (io), BA24 IO_L13N_34 (io), BA25 IO_L15N_34 (io), BA26 IO_L14N_VREF_34 (io), BA27 IO_L16P_34 (io), BA29 IO_L19P_34 (io), BB13 IO_L0P_34 (io), BB14 IO_L3N_34 (io), BB16 IO_L2P_34 (io), BB17 IO_L5P_34 (io), BB18 IO_L4P_34 (io), BB19 IO_L4N_VREF_34 (io), BB21 IO_L9P_CC_34 (io), BB22 IO_L9N_CC_34 (io), BB23 IO_L13P_34 (io), BB24 IO_L15P_34 (io), BB26 IO_L14P_34 (io), BB27 IO_L16N_34 (io), BB28 IO_L18N_34 (io), BB29 IO_L18P_34 (io)
part O pins: AJ18 IO_L16N_6 (io), AJ25 IO_L17P_6 (io), AK18 IO_L1P_6 (io), AK19 IO_L16P_6 (io), AK24 IO_L17N_6 (io), AK25 IO_L19N_6 (io), AL17 IO_L1N_6 (io), AL19 IO_L18P_6 (io), AL24 IO_L19P_6 (io), AL25 IO_L15P_6 (io), AL26 IO_L0P_6 (io), AM17 IO_L3N_6 (io), AM18 IO_L3P_6 (io), AM19 IO_L18N_6 (io), AM24 IO_L15N_6 (io), AM26 IO_L0N_6 (io), AN18 IO_L5P_6 (io), AN19 IO_L7P_6 (io), AN25 IO_L4N_VREF_6 (io), AN26 IO_L4P_6 (io), AP15 IO_L9N_CC_6 (io), AP16 IO_L12P_VRN_6 (io), AP17 IO_L5N_6 (io), AP18 IO_L7N_6 (io), AP26 IO_L6P_6 (io), AP27 IO_L2N_6 (io), AP28 IO_L2P_6 (io), AR13 IO_L10P_CC_6 (io), AR14 IO_L10N_CC_6 (io), AR15 IO_L9P_CC_6 (io), AR17 IO_L12N_VRP_6 (io), AR27 IO_L6N_6 (io), AR28 IO_L8P_CC_6 (io), AR29 IO_L8N_CC_6 (io), AR30 IO_L11N_CC_6 (io), AT14 IO_L14P_6 (io), AT15 IO_L14N_VREF_6 (io), AT23 VCCO_6 (power), AT29 IO_L13N_6 (io), AT30 IO_L11P_CC_6 (io), AU29 IO_L13P_6 (io), AW24 VCCO_6 (power), AY21 VCCO_6 (power), B25 VCCO_5 (power), C22 VCCO_5 (power), F23 VCCO_5 (power), G14 IO_L1P_5 (io), G16 IO_L3N_5 (io), G27 IO_L15P_5 (io), G28 IO_L17P_5 (io), G29 IO_L17N_5 (io), H14 IO_L1N_5 (io), H15 IO_L7P_5 (io), H16 IO_L3P_5 (io), H28 IO_L15N_5 (io), H29 IO_L19P_5 (io), H30 IO_L19N_5 (io), J15 IO_L7N_5 (io), J16 IO_L5N_5 (io), J17 IO_L5P_5 (io), J26 IO_L11P_CC_5 (io), J27 IO_L11N_CC_5 (io), J28 IO_L13P_5 (io), K17 IO_L12P_VRN_5 (io), K18 IO_L12N_VRP_5 (io), K19 IO_L9P_CC_5 (io), K24 IO_L4N_VREF_5 (io), K25 IO_L4P_5 (io), K27 IO_L13N_5 (io), L17 IO_L14N_VREF_5 (io), L19 IO_L9N_CC_5 (io), L24 IO_L2N_5 (io), L25 IO_L2P_5 (io), L26 IO_L6N_5 (io), M17 IO_L14P_5 (io), M18 IO_L10P_CC_5 (io), M19 IO_L10N_CC_5 (io), M24 IO_L0P_5 (io), M26 IO_L6P_5 (io), N18 IO_L16P_5 (io), N19 IO_L16N_5 (io), N24 IO_L0N_5 (io), N25 IO_L8N_CC_5 (io), P18 IO_L18N_5 (io), P25 IO_L8P_CC_5 (io), R18 IO_L18P_5 (io)